# Altium footprint library 3D_MIG_Controller.PCBLIB: 560 footprints (part 19 of 35)
Each footprint in its own frame and in the unit in brackets; x right, y up, seen from the top. Pads: shape width x height; smd on the part's side, far side on the other; paste and mask are expansions set on the pad; w line width, h text height; cw(c..) or ccw(c..) is an arc to the next point about the centre after c.
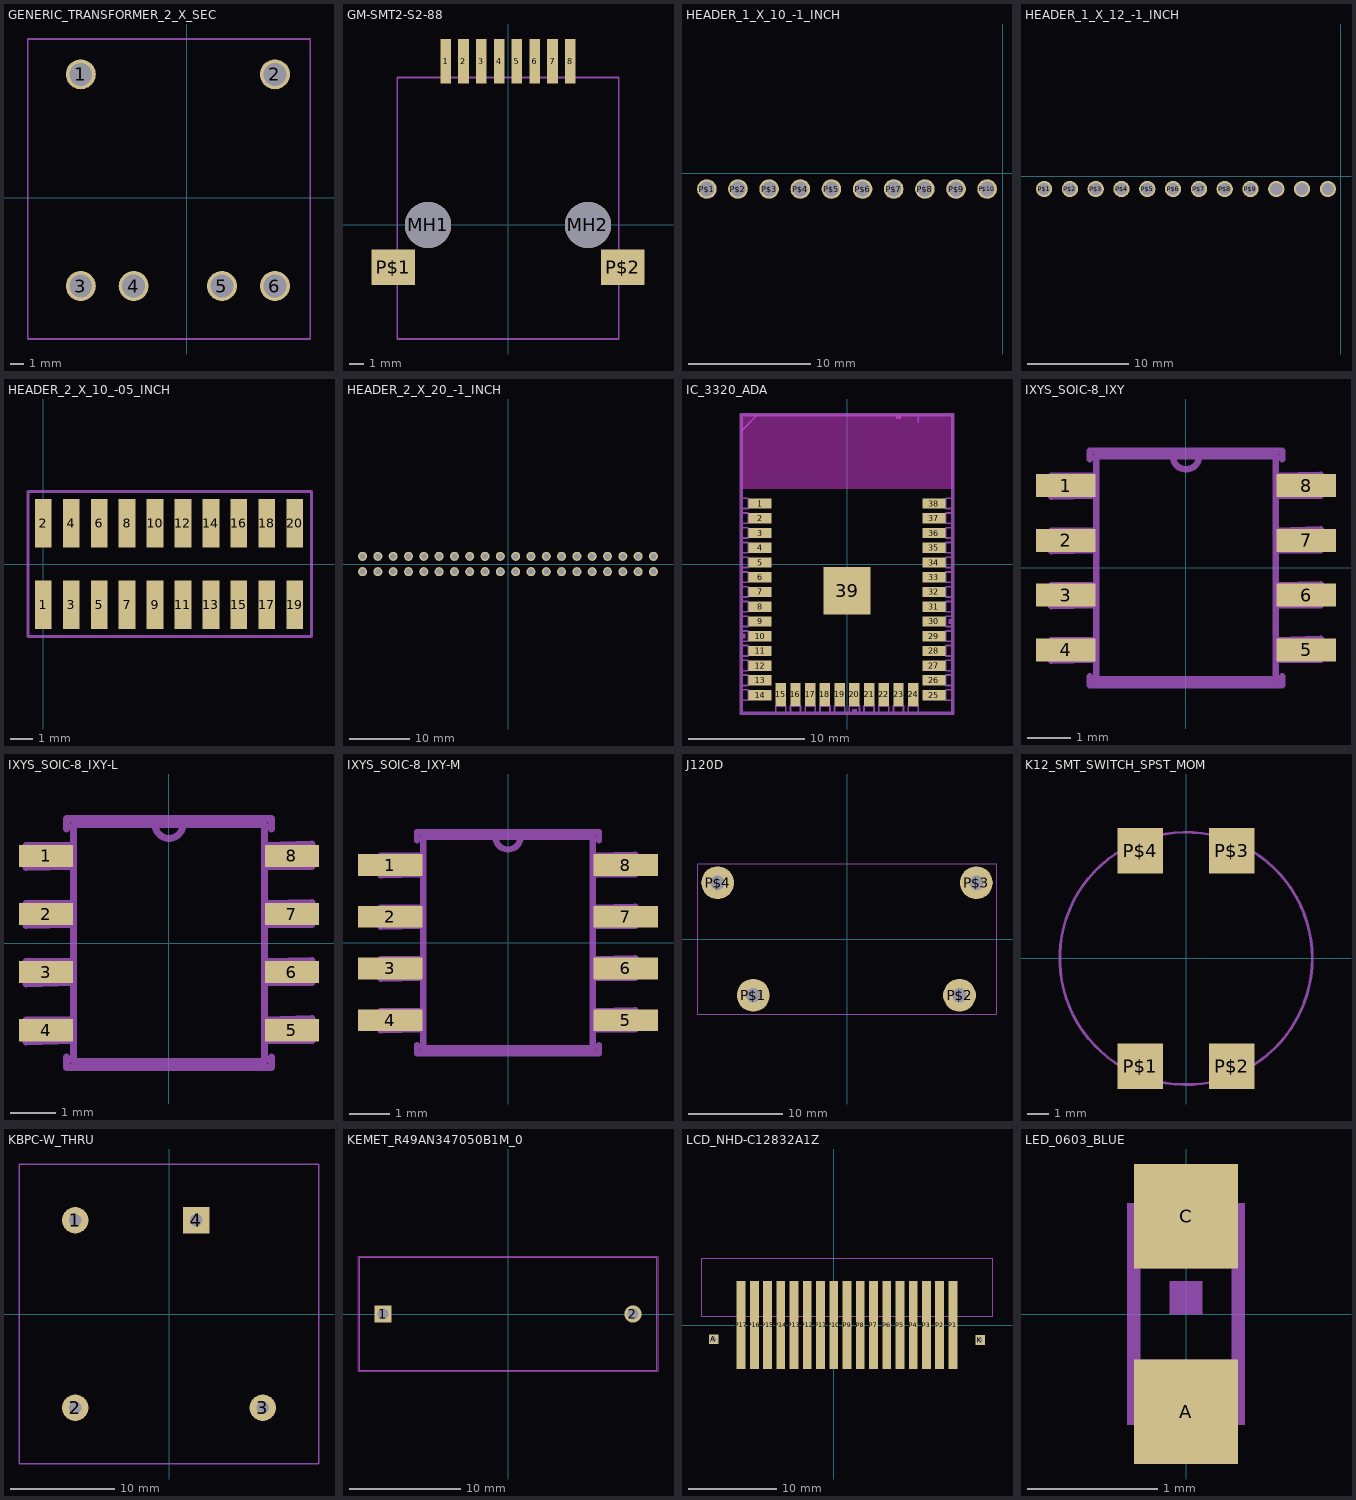
[diagram p18: the footprints below, top view; thin cyan lines are the x and y axes]

## GENERIC_TRANSFORMER_2_X_SEC [mil]
pads (6):
  round 85 hole 65: 1(-300,350) 2(250,350) 3(-300,-250) 4(-150,-250) 5(100,-250) 6(250,-250)
tPlace:
  lines w5: -450,-400 -450,450 350,450 350,-400 -450,-400
  text "Primary" at -150,250 h77.5
  text "Sec_1" at -350,-150 h77.5
  text "Sec_2" at 50,-150 h77.5

## GM-SMT2-S2-88 [mm]
pads (12):
  rect 0.76x3.185 smd: 1(-4.445,11.665) 2(-3.175,11.665) 3(-1.905,11.665) 4(-0.635,11.665) 5(0.635,11.665) 6(1.905,11.665) 7(3.175,11.665) 8(4.445,11.665)
  round 3.3 hole 3.3 unplated: MH1(-5.7,0) MH2(5.7,0)
  rect 3.12x2.54 smd: P$1(-8.175,-3.005) P$2(8.175,-3.005)
tDocu:
  lines w0.127: -7.9,-8.13 7.9,-8.13 7.9,10.52 -7.9,10.52 -7.9,-8.13

## HEADER_1_X_10_-1_INCH [mil]
pads (10):
  round 62.99 hole 47.24: P$1(-950,-50) P$2(-850,-50) P$3(-750,-50) P$4(-650,-50) P$5(-550,-50) P$6(-450,-50) P$7(-350,-50) P$8(-250,-50) P$9(-150,-50) P$10(-50,-50)

## HEADER_1_X_12_-1_INCH [mil]
pads (12):
  round 62.99 hole 47.24: P$1(-1150,-50) P$2(-1050,-50) P$3(-950,-50) P$4(-850,-50) P$5(-750,-50) P$6(-650,-50) P$7(-550,-50) P$8(-450,-50) P$9(-350,-50) P$10(-250,-50) P$11(-150,-50) P$12(-50,-50)

## HEADER_2_X_10_-05_INCH [mil]
pads (20):
  rect 30x87 smd: 1(0,-73) 2(0,73) 3(50,-73) 4(50,73) 5(100,-73) 6(100,73) 7(150,-73) 8(150,73) 9(200,-73) 10(200,73) 11(250,-73) 12(250,73) 13(300,-73) 14(300,73) 15(350,-73) 16(350,73) 17(400,-73) 18(400,73) 19(450,-73) 20(450,73)
tPlace:
  lines w5: -27.56,-129.92 -27.56,129.92 480.32,129.92 480.32,-129.92 -27.56,-129.92

## HEADER_2_X_20_-1_INCH [mm]
pads (40):
  round 1.508 hole 1: P$1(-24.13,-1.27) P$2(-24.13,1.27) P$3(-21.59,-1.27) P$4(-21.59,1.27) P$5(-19.05,-1.27) P$6(-19.05,1.27) P$7(-16.51,-1.27) P$8(-16.51,1.27) P$9(-13.97,-1.27) P$10(-13.97,1.27) P$11(-11.43,-1.27) P$12(-11.43,1.27) P$13(-8.89,-1.27) P$14(-8.89,1.27) P$15(-6.35,-1.27) P$16(-6.35,1.27) P$17(-3.81,-1.27) P$18(-3.81,1.27) P$19(-1.27,-1.27) P$20(-1.27,1.27) P$21(1.27,-1.27) P$22(1.27,1.27) P$23(3.81,-1.27) P$24(3.81,1.27) P$25(6.35,-1.27) P$26(6.35,1.27) P$27(8.89,-1.27) P$28(8.89,1.27) P$29(11.43,-1.27) P$30(11.43,1.27) P$31(13.97,-1.27) P$32(13.97,1.27) P$33(16.51,-1.27) P$34(16.51,1.27) P$35(19.05,-1.27) P$36(19.05,1.27) P$37(21.59,-1.27) P$38(21.59,1.27) P$39(24.13,-1.27) P$40(24.13,1.27)

## IC_3320_ADA [mil]
pads (39):
  rect 79x35 smd: 1(-295.15,205.06) 2(-295.15,155.06) 3(-295.15,105.06) 4(-295.15,55.06) 5(-295.15,5.06) 6(-295.15,-44.94) 7(-295.15,-94.94) 8(-295.15,-144.94) 9(-295.15,-194.94) 10(-295.15,-244.94) 11(-295.15,-294.94) 12(-295.15,-344.94) 13(-295.15,-394.94) 14(-295.15,-444.94) 25(295.15,-444.94) 26(295.15,-394.94) 27(295.15,-344.94) 28(295.15,-294.94) 29(295.15,-244.94) 30(295.15,-194.94) 31(295.15,-144.94) 32(295.15,-94.94) 33(295.15,-44.94) 34(295.15,5.06) 35(295.15,55.06) 36(295.15,105.06) 37(295.15,155.06) 38(295.15,205.06)
  rect 35x79 smd: 15(-225,-442.78) 16(-175,-442.78) 17(-125,-442.78) 18(-75,-442.78) 19(-25,-442.78) 20(25,-442.78) 21(75,-442.78) 22(125,-442.78) 23(175,-442.78) 24(225,-442.78)
  rect 161x161 smd paste+0: 39(0,-90.22)
Top keep-out:
  region: -356.5,255.97 356.5,255.97 356.5,504 -356.5,504
Top Paste:
  region: -76.56,76.56 -76.56,30.77 -30.77,30.77 -30.77,76.56
  region: -76.56,22.9 -76.56,-22.9 -30.77,-22.9 -30.77,22.9
  region: -76.56,-30.77 -76.56,-76.56 -30.77,-76.56 -30.77,-30.77
  region: -22.9,76.56 -22.9,30.77 22.9,30.77 22.9,76.56
  region: -22.9,22.9 -22.9,-22.9 22.9,-22.9 22.9,22.9
  region: -22.9,-30.77 -22.9,-76.56 22.9,-76.56 22.9,-30.77
  region: 30.77,76.56 30.77,30.77 76.56,30.77 76.56,76.56
  region: 30.77,22.9 30.77,-22.9 76.56,-22.9 76.56,22.9
  region: 30.77,-30.77 30.77,-76.56 76.56,-76.56 76.56,-30.77
tDocu:
  drawing of 197 lines, arcs and shapes, not listed
  text "*" at -278,325 h77.5
tPlace:
  region: -354.65,-237.44 -354.65,-252.44 -344.65,-252.44 -344.65,-237.44
  region: 17.5,-492.28 17.5,-502.28 32.5,-502.28 32.5,-492.28
  region: 354.65,-187.44 354.65,-202.44 344.65,-202.44 344.65,-187.44
  region: 167.5,492.28 167.5,502.28 182.5,502.28 182.5,492.28
  lines w6: -362,-509 362,-509 362,509 -362,509 -362,-509
  text "*" at -382,325 h77.5

## IXYS_SOIC-8_IXY [mil]
pads (8):
  rect 54.5x21 smd: 1(-109.75,75) 2(-109.75,25) 3(-109.75,-25) 4(-109.75,-75) 5(109.75,-75) 6(109.75,-25) 7(109.75,25) 8(109.75,75)
tDocu:
  lines w6: -12,102 12,102 ; -12,102 -82,102 -82,-102 82,-102 82,102 12,102 ; -12,102 ccw(c0,102) 12,102 ; -123,-85 -123,-66 -82,-66 -82,-84 -123,-85 ; -123,-35 -123,-16 -82,-16 -82,-34 -123,-35 ; -123,15 -123,34 -82,34 -82,16 -123,15 ; -123,65 -123,84 -82,84 -82,66 -123,65 ; 82,-84 82,-66 123,-65 123,-84 82,-84 ; 82,-34 82,-16 123,-15 123,-34 82,-34 ; 82,16 82,34 123,35 123,16 82,16 ; 82,66 82,84 123,85 123,66 82,66
  text "*" at -90,49 h77.5
tPlace:
  lines w6: -88,-99 -88,-107 88,-107 88,-99 ; -88,99 -88,107 88,107 88,99
  text "*" at -142,91 h77.5

## IXYS_SOIC-8_IXY-L [mil]
pads (8):
  rect 46.5x19 smd: 1(-105.75,75) 2(-105.75,25) 3(-105.75,-25) 4(-105.75,-75) 5(105.75,-75) 6(105.75,-25) 7(105.75,25) 8(105.75,75)
tDocu:
  lines w6: -12,102 12,102 ; -12,102 -82,102 -82,-102 82,-102 82,102 12,102 ; -12,102 ccw(c0,102) 12,102 ; -123,-85 -123,-66 -82,-66 -82,-84 -123,-85 ; -123,-35 -123,-16 -82,-16 -82,-34 -123,-35 ; -123,15 -123,34 -83,34 -82,16 -123,15 ; -123,65 -123,84 -83,84 -82,66 -123,65 ; 82,-66 83,-84 123,-84 123,-65 82,-66 ; 82,-34 82,-16 123,-15 123,-34 82,-34 ; 82,16 82,34 123,35 123,16 82,16 ; 82,66 82,84 123,85 123,66 82,66
  text "*" at -90,49 h77.5
tPlace:
  lines w6: -88,-98 -88,-107 88,-107 88,-98 ; -88,98 -88,107 88,107 88,98
  text "*" at -138,89 h77.5

## IXYS_SOIC-8_IXY-M [mil]
pads (8):
  rect 62.5x21 smd: 1(-113.75,75) 2(-113.75,25) 3(-113.75,-25) 4(-113.75,-75) 5(113.75,-75) 6(113.75,-25) 7(113.75,25) 8(113.75,75)
tDocu:
  lines w6: -12,102 12,102 ; -12,102 -82,102 -82,-102 82,-102 82,102 12,102 ; -12,102 ccw(c0,102) 12,102 ; -123,-85 -123,-66 -82,-66 -82,-84 -123,-85 ; -123,-35 -123,-16 -82,-16 -82,-34 -123,-35 ; -123,15 -123,34 -83,34 -82,16 -123,15 ; -123,65 -123,84 -83,84 -82,66 -123,65 ; 82,-66 83,-84 123,-84 123,-65 82,-66 ; 82,-34 82,-16 123,-15 123,-34 82,-34 ; 82,16 82,34 123,35 123,16 82,16 ; 82,66 82,84 123,85 123,66 82,66
  text "*" at -90,49 h77.5
tPlace:
  lines w6: -88,-99 -88,-107 88,-107 88,-99 ; -88,99 -88,107 88,107 88,99
  text "*" at -146,91 h77.5

## J120D [mm]
pads (4):
  round 3.5 hole 1.5: P$1(-10,-6) P$2(12,-6) P$3(13.8,6) P$4(-13.8,6)
tPlace:
  lines w0.1: -16,-8 -16,8 16,8 16,-8 -16,-8

## K12_SMT_SWITCH_SPST_MOM [mil]
pads (4):
  rect 82.68x82.68 smd: P$1(-82.68,-194.88) P$2(82.68,-194.88) P$3(82.68,194.88) P$4(-82.68,194.88)
Top Overlay:
tDocu:
  circle w5: c0,0 r228.35

## KBPC-W_THRU [mm]
pads (4):
  round 2.54 hole 1.2: 1(-9,9) 2(-9,-9) 3(9,-9)
  rect 2.54x2.54 / inner round 2.347 / far side rect 2.54x2.54 hole 1.2: 4(2.6,9)
tPlace:
  lines w0.127: -14.4,-14.4 -14.4,14.4 14.4,14.4 14.4,-14.4 -14.4,-14.4
  text "+" at 16,2.3 h1.97
  text "-" at -16.5,-9.9 h1.97
  text "AC" at -18,9 h1.97
  text "AC" at 16.7,-10.1 h1.97

## KEMET_R49AN347050B1M_0 [mm]
pads (2):
  rect 1.55x1.55 / inner round 1.432 / far side rect 1.55x1.55 hole 1: 1(-11.25,0)
  round 1.55 hole 1: 2(11.25,0)
Top keep-out:
  lines w0.1: -13.5,-5.2 -13.5,5.2 13.5,5.2 13.5,-5.2 -13.5,-5.2
tDocu:
  lines w0.15: -13.4,-5.1 -13.4,5.1 13.4,5.1 13.4,-5.1 -13.4,-5.1
tPlace:
  lines w0.15: -13.4,-5.1 13.4,-5.1 13.4,5.1 -13.4,5.1 -13.4,-5.1

## LCD_NHD-C12832A1Z [mm]
pads (19):
  rect 1.108x1.108 / inner round 1.024 / far side rect 1.108x1.108 hole 0.6: A(-13.6,-1.6) K(16.6,-1.7)
  rect 1x10 smd: P1(13.5,0) P2(12,0) P3(10.5,0) P4(9,0) P5(7.5,0) P6(6,0) P7(4.5,0) P8(3,0) P9(1.5,0) P10(0,0) P11(-1.5,0) P12(-3,0) P13(-4.5,0) P14(-6,0) P15(-7.5,0) P16(-9,0) P17(-10.5,0)
tPlace:
  lines w0.127: -15,1 -15,7.5 18,7.5 18,1 -15,1

## LED_0603_BLUE [mil]
pads (2):
  rect 31.5x31.5 smd: A(0,-29.53) C(0,29.53)
tDocu:
  circle w2: c-13.78,24.61 r2.95
  region: -17.72,27.56 -17.72,33.46 -9.84,33.46 -9.84,27.56
  region: -10.83,21.65 -10.83,23.62 -8.86,23.62 -8.86,21.65
  region: -17.72,13.78 -17.72,28.54 -15.75,28.54 -15.75,13.78
  region: 9.84,21.65 9.84,33.46 17.72,33.46 17.72,21.65
  region: -17.72,13.78 -17.72,22.64 17.72,22.64 17.72,13.78
  region: -17.72,-33.46 -17.72,-13.78 -9.84,-13.78 -9.84,-33.46
  region: 9.84,-33.46 9.84,-13.78 17.72,-13.78 17.72,-33.46
  region: -10.83,-22.64 -10.83,-13.78 10.83,-13.78 10.83,-22.64
  region: -10.83,-25.59 -10.83,-21.65 -6.89,-21.65 -6.89,-25.59
  region: 6.89,-25.59 6.89,-21.65 10.83,-21.65 10.83,-25.59
  lines w2: -10.83,-32.48 cw(c0,-32.48) 10.83,-32.48
  lines w4: -15.75,-13.78 -15.75,14.76 ; -11.81,31.5 ccw(c0,32.53) 11.81,31.5 ; 15.75,-13.78 15.75,13.78
tValues:
  text "BLUE" at 75,-50 h23.25
tPlace:
  region: -4.92,0 -4.92,9.84 4.92,9.84 4.92,0